# Altium footprint library Connectors.PcbLib: 158 footprints (part 7 of 10)
Each footprint in its own frame and in the unit in brackets; x right, y up, seen from the top. Pads: shape width x height; smd on the part's side, far side on the other; paste and mask are expansions set on the pad; w line width, h text height; cw(c..) or ccw(c..) is an arc to the next point about the centre after c.
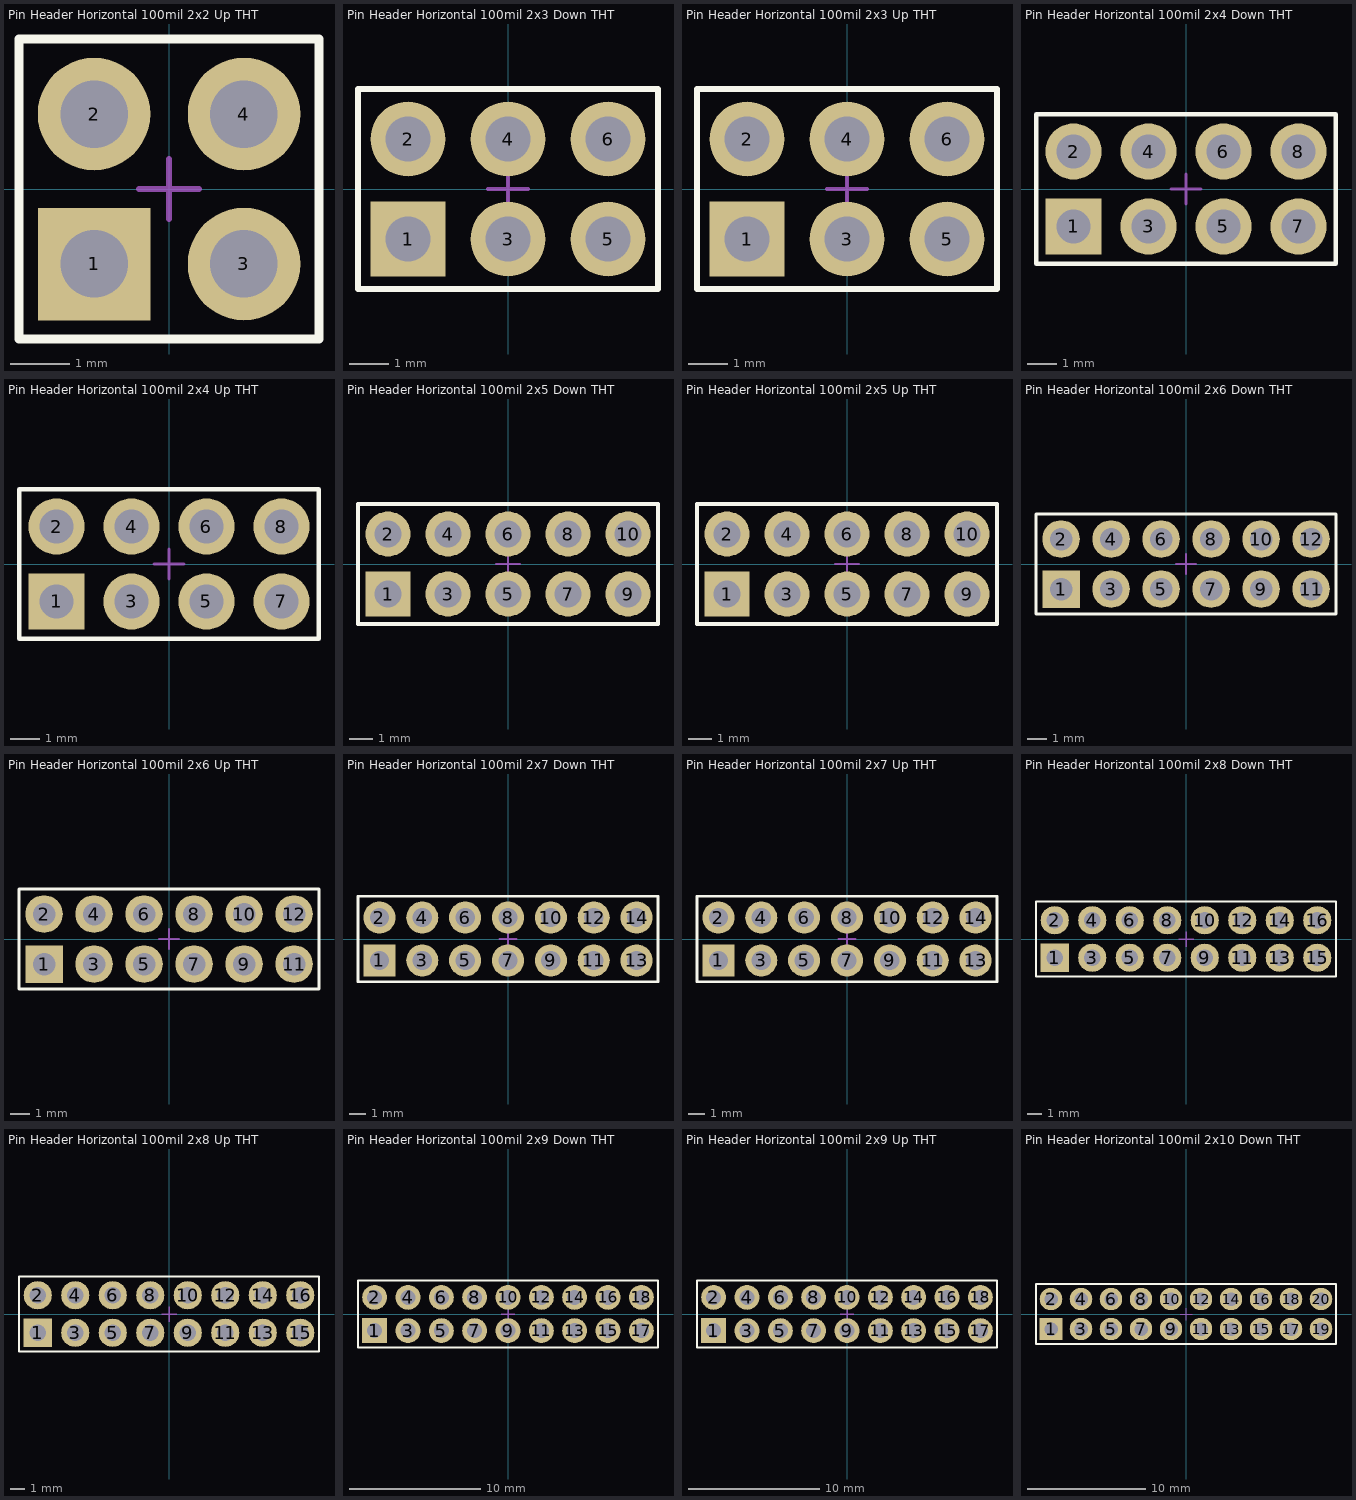
[diagram p6: the footprints below, top view; thin cyan lines are the x and y axes]

## Pin Header Horizontal 100mil 2x2 Up THT [mil]
pads (4):
  rect 75x75 hole 45: 1(-50,-50)
  round 75 hole 45: 2(-50,50) 3(50,-50) 4(50,50)
Top Overlay:
  lines w6: -100,-100 -100,100 100,100 100,-100 -100,-100
Mechanical 15:
  lines w4: -20,0 20,0 ; 0,-20 0,20
3D body "pin_header_horizontal_100mil_2x4_THT.stp": height 201, standoff -117.11, extent -99.99,-59.36 100.01,448.51
3D body "pin_header_horizontal_100mil_2x2_THT.stp": height 201, standoff -117.11, extent -99.99,-59.36 100.01,448.51

## Pin Header Horizontal 100mil 2x3 Down THT [mil]
pads (6):
  rect 75x75 hole 45: 1(-100,-50)
  round 75 hole 45: 2(-100,50) 3(0,-50) 4(0,50) 5(100,-50) 6(100,50)
Top Overlay:
  lines w6: -150,-100 150,-100 150,100 -150,100 -150,-100
Mechanical 15:
  lines w4: -20,0 20,0 ; 0,-20 0,20
3D body "pin_header_horizontal_100mil_2x3_THT.stp": height 201, standoff -117.11, extent -150,-446.22 150,61.65

## Pin Header Horizontal 100mil 2x3 Up THT [mil]
pads (6):
  rect 75x75 hole 45: 1(-100,-50)
  round 75 hole 45: 2(-100,50) 3(0,-50) 4(0,50) 5(100,-50) 6(100,50)
Top Overlay:
  lines w6: -150,-100 150,-100 150,100 -150,100 -150,-100
Mechanical 15:
  lines w4: -20,0 20,0 ; 0,-20 0,20
3D body "pin_header_horizontal_100mil_2x3_THT.stp": height 201, standoff -117.11, extent -150,-61.65 150,446.22

## Pin Header Horizontal 100mil 2x4 Down THT [mil]
pads (8):
  rect 75x75 hole 45: 1(-150,-50)
  round 75 hole 45: 2(-150,50) 3(-50,-50) 4(-50,50) 5(50,-50) 6(50,50) 7(150,-50) 8(150,50)
Top Overlay:
  lines w6: -200,-100 200,-100 200,100 -200,100 -200,-100
Mechanical 15:
  lines w4: -20,0 20,0 ; 0,-20 0,20
3D body "pin_header_horizontal_100mil_2x4_THT.stp": height 201, standoff -117.11, extent -200,-446.22 200,61.65

## Pin Header Horizontal 100mil 2x4 Up THT [mil]
pads (8):
  rect 75x75 hole 45: 1(-150,-50)
  round 75 hole 45: 2(-150,50) 3(-50,-50) 4(-50,50) 5(50,-50) 6(50,50) 7(150,-50) 8(150,50)
Top Overlay:
  lines w6: -200,-100 200,-100 200,100 -200,100 -200,-100
Mechanical 15:
  lines w4: -20,0 20,0 ; 0,-20 0,20
3D body "pin_header_horizontal_100mil_2x4_THT.stp": height 201, standoff -117.11, extent -199.99,-61.65 200.01,446.23

## Pin Header Horizontal 100mil 2x5 Down THT [mil]
pads (10):
  rect 75x75 hole 45: 1(-200,-50)
  round 75 hole 45: 2(-200,50) 3(-100,-50) 4(-100,50) 5(0,-50) 6(0,50) 7(100,-50) 8(100,50) 9(200,-50) 10(200,50)
Top Overlay:
  lines w6: -250,-100 250,-100 250,100 -250,100 -250,-100
Mechanical 15:
  lines w4: -20,0 20,0 ; 0,-20 0,20
3D body "pin_header_horizontal_100mil_2x5_THT.stp": height 201, standoff -117.11, extent -250,-443.94 250,63.94

## Pin Header Horizontal 100mil 2x5 Up THT [mil]
pads (10):
  rect 75x75 hole 45: 1(-200,-50)
  round 75 hole 45: 2(-200,50) 3(-100,-50) 4(-100,50) 5(0,-50) 6(0,50) 7(100,-50) 8(100,50) 9(200,-50) 10(200,50)
Top Overlay:
  lines w6: -250,-100 250,-100 250,100 -250,100 -250,-100
Mechanical 15:
  lines w4: -20,0 20,0 ; 0,-20 0,20
3D body "pin_header_horizontal_100mil_2x5_THT.stp": height 201, standoff -117.11, extent -249.99,-61.65 250.01,446.23

## Pin Header Horizontal 100mil 2x6 Down THT [mil]
pads (12):
  rect 75x75 hole 45: 1(-250,-50)
  round 75 hole 45: 2(-250,50) 3(-150,-50) 4(-150,50) 5(-50,-50) 6(-50,50) 7(50,-50) 8(50,50) 9(150,-50) 10(150,50) 11(250,-50) 12(250,50)
Top Overlay:
  lines w6: -300,-100 -300,100 300,100 300,-100 -300,-100
Mechanical 15:
  lines w4: -20,0 20,0 ; 0,-20 0,20
3D body "pin_header_horizontal_100mil_2x6_THT.stp": height 201, standoff -117.11, extent -300,-446.22 300,61.65

## Pin Header Horizontal 100mil 2x6 Up THT [mil]
pads (12):
  rect 75x75 hole 45: 1(-250,-50)
  round 75 hole 45: 2(-250,50) 3(-150,-50) 4(-150,50) 5(-50,-50) 6(-50,50) 7(50,-50) 8(50,50) 9(150,-50) 10(150,50) 11(250,-50) 12(250,50)
Top Overlay:
  lines w6: -300,-100 300,-100 300,100 -300,100 -300,-100
Mechanical 15:
  lines w4: -20,0 20,0 ; 0,-20 0,20
3D body "pin_header_horizontal_100mil_2x6_THT.stp": height 201, standoff -117.11, extent -299.99,-61.65 300.01,446.23

## Pin Header Horizontal 100mil 2x7 Down THT [mil]
pads (14):
  rect 75x75 hole 45: 1(-300,-50)
  round 75 hole 45: 2(-300,50) 3(-200,-50) 4(-200,50) 5(-100,-50) 6(-100,50) 7(0,-50) 8(0,50) 9(100,-50) 10(100,50) 11(200,-50) 12(200,50) 13(300,-50) 14(300,50)
Top Overlay:
  lines w6: -350,-100 350,-100 350,100 -350,100 -350,-100
Mechanical 15:
  lines w4: -20,0 20,0 ; 0,-20 0,20
3D body "pin_header_horizontal_100mil_2x7_THT.stp": height 201, standoff -117.11, extent -350,-446.22 350,61.65

## Pin Header Horizontal 100mil 2x7 Up THT [mil]
pads (14):
  rect 75x75 hole 45: 1(-300,-50)
  round 75 hole 45: 2(-300,50) 3(-200,-50) 4(-200,50) 5(-100,-50) 6(-100,50) 7(0,-50) 8(0,50) 9(100,-50) 10(100,50) 11(200,-50) 12(200,50) 13(300,-50) 14(300,50)
Top Overlay:
  lines w6: -350,-100 350,-100 350,100 -350,100 -350,-100
Mechanical 15:
  lines w4: -20,0 20,0 ; 0,-20 0,20
3D body "pin_header_horizontal_100mil_2x7_THT.stp": height 201, standoff -117.11, extent -350,-60 350,447.88

## Pin Header Horizontal 100mil 2x8 Down THT [mil]
pads (16):
  rect 75x75 hole 45: 1(-350,-50)
  round 75 hole 45: 2(-350,50) 3(-250,-50) 4(-250,50) 5(-150,-50) 6(-150,50) 7(-50,-50) 8(-50,50) 9(50,-50) 10(50,50) 11(150,-50) 12(150,50) 13(250,-50) 14(250,50) 15(350,-50) 16(350,50)
Top Overlay:
  lines w6: -400,-100 400,-100 400,100 -400,100 -400,-100
Mechanical 15:
  lines w4: -20,0 20,0 ; 0,-20 0,20
3D body "pin_header_horizontal_100mil_2x8_THT.stp": height 201, standoff -117.11, extent -400,-446.22 400,61.65

## Pin Header Horizontal 100mil 2x8 Up THT [mil]
pads (16):
  rect 75x75 hole 45: 1(-350,-50)
  round 75 hole 45: 2(-350,50) 3(-250,-50) 4(-250,50) 5(-150,-50) 6(-150,50) 7(-50,-50) 8(-50,50) 9(50,-50) 10(50,50) 11(150,-50) 12(150,50) 13(250,-50) 14(250,50) 15(350,-50) 16(350,50)
Top Overlay:
  lines w6: -400,-100 -400,100 400,100 400,-100 -400,-100
Mechanical 15:
  lines w4: -20,0 20,0 ; 0,-20 0,20
3D body "pin_header_horizontal_100mil_2x8_THT.stp": height 201, standoff -117.11, extent -400,-60 400,447.88

## Pin Header Horizontal 100mil 2x9 Down THT [mil]
pads (18):
  rect 75x75 hole 45: 1(-400,-50)
  round 75 hole 45: 2(-400,50) 3(-300,-50) 4(-300,50) 5(-200,-50) 6(-200,50) 7(-100,-50) 8(-100,50) 9(0,-50) 10(0,50) 11(100,-50) 12(100,50) 13(200,-50) 14(200,50) 15(300,-50) 16(300,50) 17(400,-50) 18(400,50)
Top Overlay:
  lines w6: -450,-100 -450,100 450,100 450,-100 -450,-100
Mechanical 15:
  lines w4: -20,0 20,0 ; 0,-20 0,20
3D body "pin_header_horizontal_100mil_2x9_THT.stp": height 201, standoff -117.11, extent -450,-446.22 450,61.65

## Pin Header Horizontal 100mil 2x9 Up THT [mil]
pads (18):
  rect 75x75 hole 45: 1(-400,-50)
  round 75 hole 45: 2(-400,50) 3(-300,-50) 4(-300,50) 5(-200,-50) 6(-200,50) 7(-100,-50) 8(-100,50) 9(0,-50) 10(0,50) 11(100,-50) 12(100,50) 13(200,-50) 14(200,50) 15(300,-50) 16(300,50) 17(400,-50) 18(400,50)
Top Overlay:
  lines w6: -450,-100 -450,100 450,100 450,-100 -450,-100
Mechanical 15:
  lines w4: -20,0 20,0 ; 0,-20 0,20
3D body "pin_header_horizontal_100mil_2x9_THT.stp": height 201, standoff -117.11, extent -449.99,-61.65 450.01,446.23

## Pin Header Horizontal 100mil 2x10 Down THT [mil]
pads (20):
  rect 75x75 hole 45: 1(-450,-50)
  round 75 hole 45: 2(-450,50) 3(-350,-50) 4(-350,50) 5(-250,-50) 6(-250,50) 7(-150,-50) 8(-150,50) 9(-50,-50) 10(-50,50) 11(50,-50) 12(50,50) 13(150,-50) 14(150,50) 15(250,-50) 16(250,50) 17(350,-50) 18(350,50) 19(450,-50) 20(450,50)
Top Overlay:
  lines w6: -500,-100 500,-100 500,100 -500,100 -500,-100
Mechanical 15:
  lines w4: -20,0 20,0 ; 0,-20 0,20
3D body "pin_header_horizontal_100mil_2x10_THT.stp": height 201, standoff -117.11, extent -500,-446.22 500,61.65